# Altium integrated library 电阻类.IntLib: 3 symbols
Pins are listed as number, name and electrical type; pins without a type are passive.

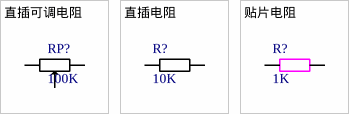
[diagram p0: symbols 直插可调电阻 to 贴片电阻]

## 直插可调电阻
designator RP?, comment 100K
footprint 多圈绕线可调电阻
footprint 蓝白可调电阻
footprint 电位器-2
pins: 1, 2, 3

## 直插电阻
designator R?, comment 10K
footprint R-3
footprint R-4
footprint R-5
footprint R-6
footprint 水泥电阻
pins: 1, 2

## 贴片电阻
designator R?, comment 1K
footprint R0402
footprint R0603
footprint R0805
footprint R1206
footprint R1210
footprint R1812
footprint R2512
pins: 1, 2